# Altium schematic symbol library Molex FFC - FPC Connectors (SMT).SchLib: 638 symbols (part 9 of 10) (continued)
## 501912-2790 (continued)
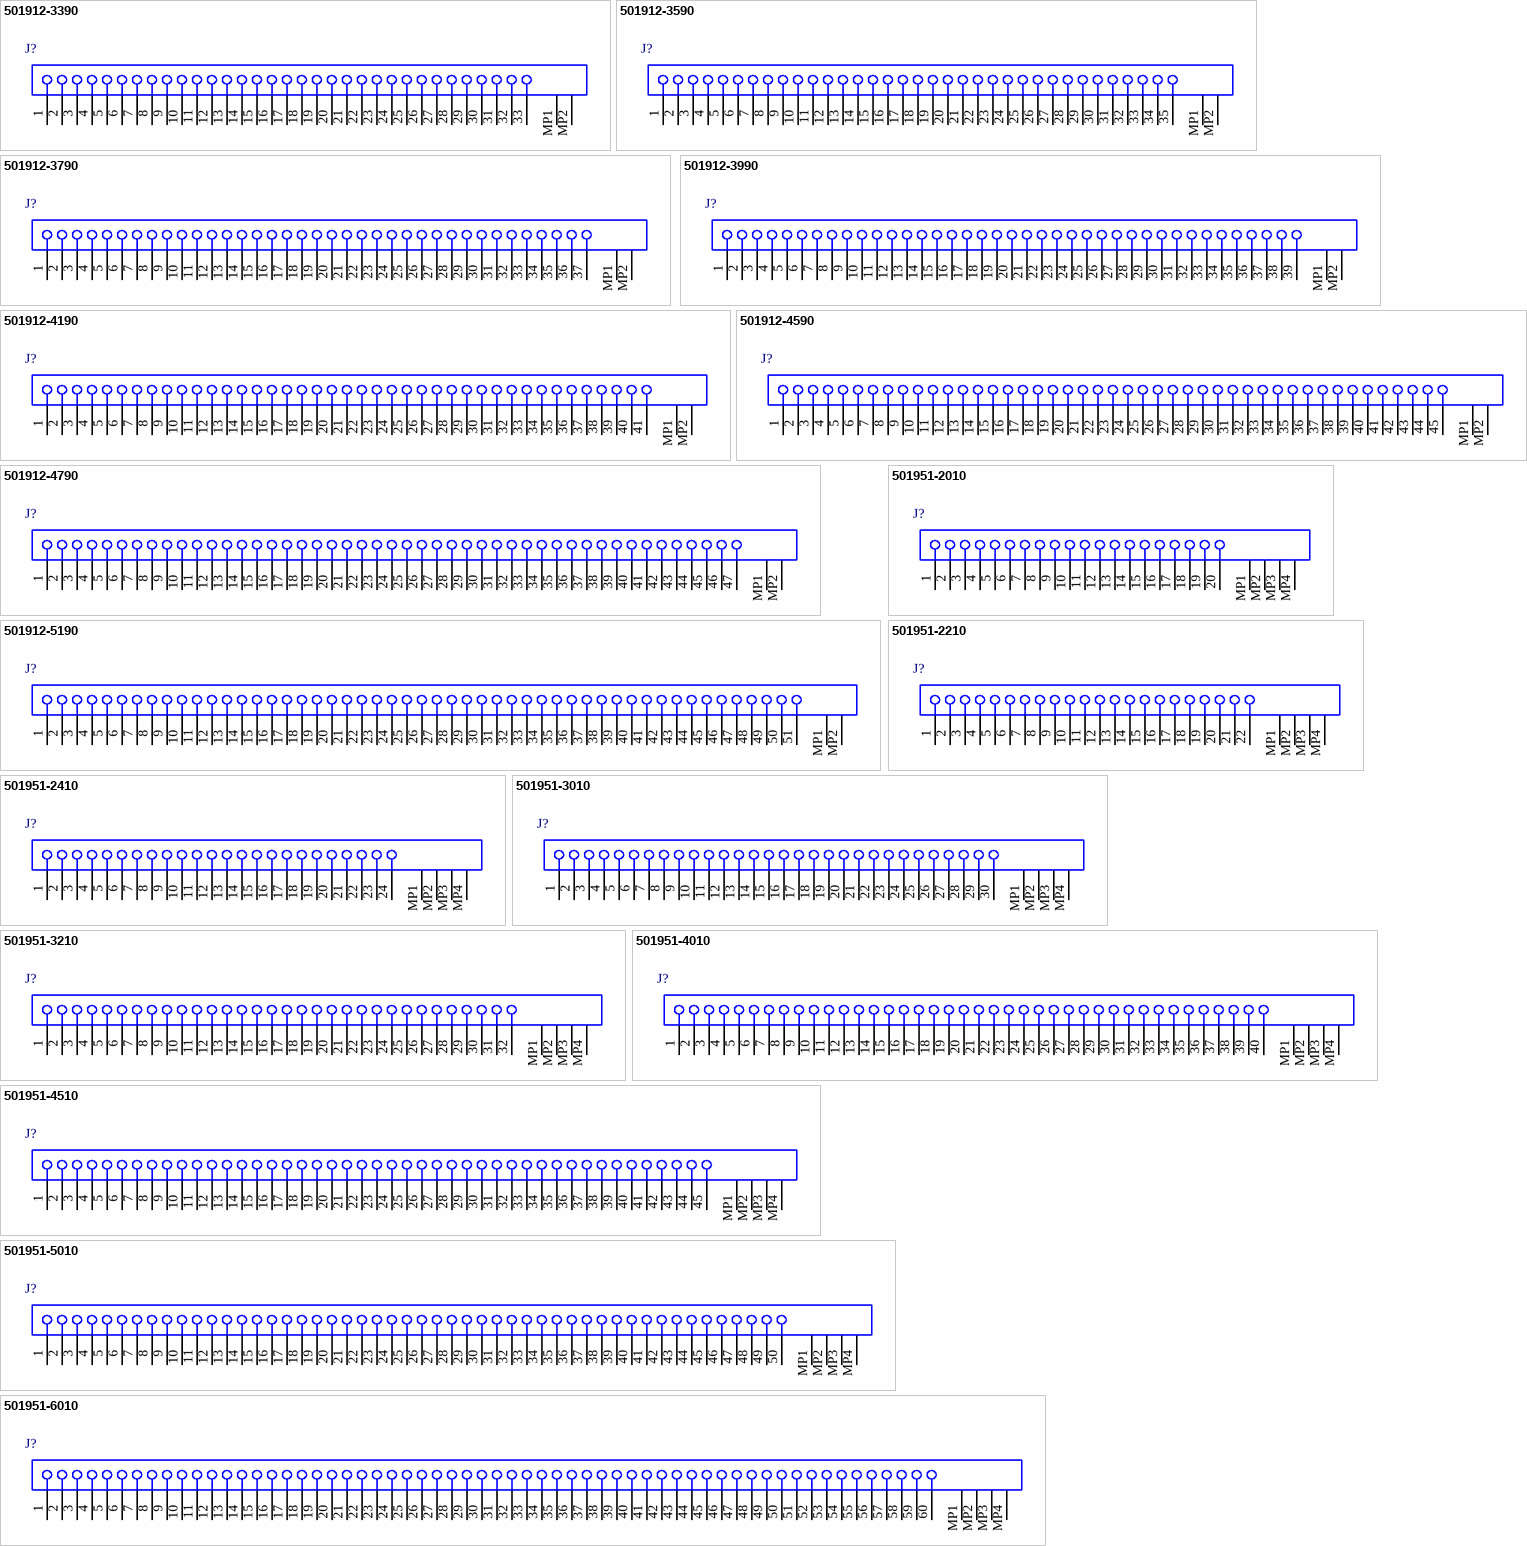
[diagram p17: symbols 501912-3390 to 501951-6010]

## 501912-3390
designator J?
0.3 mm Pitch Easy-On(TM) Type FPC Connector, 1.8 mm Mated Height, Right Angle, SMT, Bottom Contact, 33 Circuits, -20 to 85 degC, ELV and RoHS Compliant, Tape and Reel; Manufacturer: Molex; PartNumber: 501912-3390; Circuits (Loaded): 33; Current (Max per Contact): 0.2A; Durability (mating cycles max): 20; Entry Angle: 90degrees Angle; Mated Height: 1.80mm; Material - Metal: Copper, Phosphor Bronze; Material - Plating Mating: Gold; PCB Locator: No; PCB Retention: None; Pitch - Mating Interface: 0.30mm; Voltage (Max): 50V AC (RMS)/DC; PackageVersion: Rev. F, 04/2008; PackageReference: 501912-3390; PackageDescription: 33-Lead FPC Connector, Pitch 0.3 mm; Circuits (maximum): 33; Contact Position: Bottom; Material - Plating Termination: Gold; Number of Rows: 1; Orientation: Right Angle; Packing: Tape and Reel; Pitch - Termination Interface: 0.30mm; Polarized to PCB: No; RoHS: TRUE; Stackable: No; Mounting Technology: Surface Mount; ComponentLink1Description: Manufacturer URL; ComponentLink1URL: http://www.molex.com/molex/index.jsp; ComponentLink2Description: Datasheet; ComponentLink2URL: http://www.molex.com/webdocs/datasheets/pdf/en-us/5019123390_FFC_FPC_CONNECTORS.pdf; ComponentLink3Description: Package Specification; ComponentLink3URL: http://www.molex.com/pdm_docs/sd/5019123390_sd.pdf
footprint MOLX-501912-3390 (FPC Connector, 33-Leads, Right Angle, Pitch 0.3 mm, Mated Height 1.8 mm, SMT)
pins: 1, 2, 3, 4, 5, 6, 7, 8, 9, 10, 11, 12, 13, 14, 15, 16, 17, 18, 19, 20, 21, 22, 23, 24, 25, 26, 27, 28, 29, 30, 31, 32, 33, MP1, MP2

## 501912-3590
designator J?
0.3 mm Pitch Easy-On(TM) Type FPC Connector, 1.8 mm Mated Height, Right Angle, SMT, Bottom Contact, 35 Circuits, -20 to 85 degC, ELV and RoHS Compliant, Tape and Reel; Manufacturer: Molex; PartNumber: 501912-3590; Circuits (Loaded): 35; Current (Max per Contact): 0.2A; Durability (mating cycles max): 20; Entry Angle: 90degrees Angle; Mated Height: 1.80mm; Material - Metal: Copper, Phosphor Bronze; Material - Plating Mating: Gold; PCB Locator: No; PCB Retention: None; Pitch - Mating Interface: 0.30mm; Voltage (Max): 50V AC (RMS)/DC; PackageVersion: Rev. F, 04/2008; PackageReference: 501912-3590; PackageDescription: 35-Lead FPC Connector, Pitch 0.3 mm; Circuits (maximum): 35; Contact Position: Bottom; Material - Plating Termination: Gold; Number of Rows: 1; Orientation: Right Angle; Packing: Tape and Reel; Pitch - Termination Interface: 0.30mm; Polarized to PCB: No; RoHS: TRUE; Stackable: No; Mounting Technology: Surface Mount; ComponentLink1Description: Manufacturer URL; ComponentLink1URL: http://www.molex.com/molex/index.jsp; ComponentLink2Description: Datasheet; ComponentLink2URL: http://www.molex.com/webdocs/datasheets/pdf/en-us/5019123590_FFC_FPC_CONNECTORS.pdf; ComponentLink3Description: Package Specification; ComponentLink3URL: http://www.molex.com/pdm_docs/sd/5019123590_sd.pdf
footprint MOLX-501912-3590 (FPC Connector, 35-Leads, Right Angle, Pitch 0.3 mm, Mated Height 1.8 mm, SMT)
pins: 1, 2, 3, 4, 5, 6, 7, 8, 9, 10, 11, 12, 13, 14, 15, 16, 17, 18, 19, 20, 21, 22, 23, 24, 25, 26, 27, 28, 29, 30, 31, 32, 33, 34, 35, MP1, MP2

## 501912-3790
designator J?
0.3 mm Pitch Easy-On(TM) Type FPC Connector, 1.8 mm Mated Height, Right Angle, SMT, Bottom Contact, 37 Circuits, -20 to 85 degC, ELV and RoHS Compliant, Tape and Reel; Manufacturer: Molex; PartNumber: 501912-3790; Circuits (Loaded): 37; Current (Max per Contact): 0.2A; Durability (mating cycles max): 20; Entry Angle: 90degrees Angle; Mated Height: 1.80mm; Material - Metal: Copper, Phosphor Bronze; Material - Plating Mating: Gold; PCB Locator: No; PCB Retention: None; Pitch - Mating Interface: 0.30mm; Voltage (Max): 50V AC (RMS)/DC; PackageVersion: Rev. F, 04/2008; PackageReference: 501912-3790; PackageDescription: 37-Lead FPC Connector, Pitch 0.3 mm; Circuits (maximum): 37; Contact Position: Bottom; Material - Plating Termination: Gold; Number of Rows: 1; Orientation: Right Angle; Packing: Tape and Reel; Pitch - Termination Interface: 0.30mm; Polarized to PCB: No; RoHS: TRUE; Stackable: No; Mounting Technology: Surface Mount; ComponentLink1Description: Manufacturer URL; ComponentLink1URL: http://www.molex.com/molex/index.jsp; ComponentLink2Description: Datasheet; ComponentLink2URL: http://www.molex.com/webdocs/datasheets/pdf/en-us/5019123790_FFC_FPC_CONNECTORS.pdf; ComponentLink3Description: Package Specification; ComponentLink3URL: http://www.molex.com/pdm_docs/sd/5019123790_sd.pdf
footprint MOLX-501912-3790 (FPC Connector, 37-Leads, Right Angle, Pitch 0.3 mm, Mated Height 1.8 mm, SMT)
pins: 1, 2, 3, 4, 5, 6, 7, 8, 9, 10, 11, 12, 13, 14, 15, 16, 17, 18, 19, 20, 21, 22, 23, 24, 25, 26, 27, 28, 29, 30, 31, 32, 33, 34, 35, 36, 37, MP1, MP2

## 501912-3990
designator J?
0.3 mm Pitch Easy-On(TM) Type FPC Connector, 1.8 mm Mated Height, Right Angle, SMT, Bottom Contact, 39 Circuits, -20 to 85 degC, ELV and RoHS Compliant, Tape and Reel; Manufacturer: Molex; PartNumber: 501912-3990; Circuits (Loaded): 39; Current (Max per Contact): 0.2A; Durability (mating cycles max): 20; Entry Angle: 90degrees Angle; Mated Height: 1.80mm; Material - Metal: Copper, Phosphor Bronze; Material - Plating Mating: Gold; PCB Locator: No; PCB Retention: None; Pitch - Mating Interface: 0.30mm; Voltage (Max): 50V AC (RMS)/DC; PackageVersion: Rev. F, 04/2008; PackageReference: 501912-3990; PackageDescription: 39-Lead FPC Connector, Pitch 0.3 mm; Circuits (maximum): 39; Contact Position: Bottom; Material - Plating Termination: Gold; Number of Rows: 1; Orientation: Right Angle; Packing: Tape and Reel; Pitch - Termination Interface: 0.30mm; Polarized to PCB: No; RoHS: TRUE; Stackable: No; Mounting Technology: Surface Mount; ComponentLink1Description: Manufacturer URL; ComponentLink1URL: http://www.molex.com/molex/index.jsp; ComponentLink2Description: Datasheet; ComponentLink2URL: http://www.molex.com/webdocs/datasheets/pdf/en-us/5019123990_FFC_FPC_CONNECTORS.pdf; ComponentLink3Description: Package Specification; ComponentLink3URL: http://www.molex.com/pdm_docs/sd/5019123990_sd.pdf
footprint MOLX-501912-3990 (FPC Connector, 39-Leads, Right Angle, Pitch 0.3 mm, Mated Height 1.8 mm, SMT)
pins: 1, 2, 3, 4, 5, 6, 7, 8, 9, 10, 11, 12, 13, 14, 15, 16, 17, 18, 19, 20, 21, 22, 23, 24, 25, 26, 27, 28, 29, 30, 31, 32, 33, 34, 35, 36, 37, 38, 39, MP1, MP2

## 501912-4190
designator J?
0.3 mm Pitch Easy-On(TM) Type FPC Connector, 1.8 mm Mated Height, Right Angle, SMT, Bottom Contact, 41 Circuits, -20 to 85 degC, ELV and RoHS Compliant, Tape and Reel; Manufacturer: Molex; PartNumber: 501912-4190; Circuits (Loaded): 41; Current (Max per Contact): 0.2A; Durability (mating cycles max): 20; Entry Angle: 90degrees Angle; Mated Height: 1.80mm; Material - Metal: Copper, Phosphor Bronze; Material - Plating Mating: Gold; PCB Locator: No; PCB Retention: None; Pitch - Mating Interface: 0.30mm; Voltage (Max): 50V AC (RMS)/DC; PackageVersion: Rev. F, 04/2008; PackageReference: 501912-4190; PackageDescription: 41-Lead FPC Connector, Pitch 0.3 mm; Circuits (maximum): 41; Contact Position: Bottom; Material - Plating Termination: Gold; Number of Rows: 1; Orientation: Right Angle; Packing: Tape and Reel; Pitch - Termination Interface: 0.30mm; Polarized to PCB: No; RoHS: TRUE; Stackable: No; Mounting Technology: Surface Mount; ComponentLink1Description: Manufacturer URL; ComponentLink1URL: http://www.molex.com/molex/index.jsp; ComponentLink2Description: Datasheet; ComponentLink2URL: http://www.molex.com/webdocs/datasheets/pdf/en-us/5019124190_FFC_FPC_CONNECTORS.pdf; ComponentLink3Description: Package Specification; ComponentLink3URL: http://www.molex.com/pdm_docs/sd/5019124190_sd.pdf
footprint MOLX-501912-4190 (FPC Connector, 41-Leads, Right Angle, Pitch 0.3 mm, Mated Height 1.8 mm, SMT)
pins: 1, 2, 3, 4, 5, 6, 7, 8, 9, 10, 11, 12, 13, 14, 15, 16, 17, 18, 19, 20, 21, 22, 23, 24, 25, 26, 27, 28, 29, 30, 31, 32, 33, 34, 35, 36, 37, 38, 39, 40, 41, MP1, MP2

## 501912-4590
designator J?
0.3 mm Pitch Easy-On(TM) Type FPC Connector, 1.8 mm Mated Height, Right Angle, SMT, Bottom Contact, 45 Circuits, -20 to 85 degC, ELV and RoHS Compliant, Tape and Reel; Manufacturer: Molex; PartNumber: 501912-4590; Circuits (Loaded): 45; Current (Max per Contact): 0.2A; Durability (mating cycles max): 20; Entry Angle: 90degrees Angle; Mated Height: 1.80mm; Material - Metal: Copper, Phosphor Bronze; Material - Plating Mating: Gold; PCB Locator: No; PCB Retention: None; Pitch - Mating Interface: 0.30mm; Voltage (Max): 50V AC (RMS)/DC; PackageVersion: Rev. F, 04/2008; PackageReference: 501912-4590; PackageDescription: 45-Lead FPC Connector, Pitch 0.3 mm; Circuits (maximum): 45; Contact Position: Bottom; Material - Plating Termination: Gold; Number of Rows: 1; Orientation: Right Angle; Packing: Tape and Reel; Pitch - Termination Interface: 0.30mm; Polarized to PCB: No; RoHS: TRUE; Stackable: No; Mounting Technology: Surface Mount; ComponentLink1Description: Manufacturer URL; ComponentLink1URL: http://www.molex.com/molex/index.jsp; ComponentLink2Description: Datasheet; ComponentLink2URL: http://www.molex.com/webdocs/datasheets/pdf/en-us/5019124590_FFC_FPC_CONNECTORS.pdf; ComponentLink3Description: Package Specification; ComponentLink3URL: http://www.molex.com/pdm_docs/sd/5019124590_sd.pdf
footprint MOLX-501912-4590 (FPC Connector, 45-Leads, Right Angle, Pitch 0.3 mm, Mated Height 1.8 mm, SMT)
pins: 1, 2, 3, 4, 5, 6, 7, 8, 9, 10, 11, 12, 13, 14, 15, 16, 17, 18, 19, 20, 21, 22, 23, 24, 25, 26, 27, 28, 29, 30, 31, 32, 33, 34, 35, 36, 37, 38, 39, 40, 41, 42, 43, 44, 45, MP1, MP2

## 501912-4790
designator J?
0.3 mm Pitch Easy-On(TM) Type FPC Connector, 1.8 mm Mated Height, Right Angle, SMT, Bottom Contact, 47 Circuits, -20 to 85 degC, ELV and RoHS Compliant, Tape and Reel; Manufacturer: Molex; PartNumber: 501912-4790; Circuits (Loaded): 47; Current (Max per Contact): 0.2A; Durability (mating cycles max): 20; Entry Angle: 90degrees Angle; Mated Height: 1.80mm; Material - Metal: Copper, Phosphor Bronze; Material - Plating Mating: Gold; PCB Locator: No; PCB Retention: None; Pitch - Mating Interface: 0.30mm; Voltage (Max): 50V AC (RMS)/DC; PackageVersion: Rev. F, 04/2008; PackageReference: 501912-4790; PackageDescription: 47-Lead FPC Connector, Pitch 0.3 mm; Circuits (maximum): 47; Contact Position: Bottom; Material - Plating Termination: Gold; Number of Rows: 1; Orientation: Right Angle; Packing: Tape and Reel; Pitch - Termination Interface: 0.30mm; Polarized to PCB: No; RoHS: TRUE; Stackable: No; Mounting Technology: Surface Mount; ComponentLink1Description: Manufacturer URL; ComponentLink1URL: http://www.molex.com/molex/index.jsp; ComponentLink2Description: Datasheet; ComponentLink2URL: http://www.molex.com/webdocs/datasheets/pdf/en-us/5019124790_FFC_FPC_CONNECTORS.pdf; ComponentLink3Description: Package Specification; ComponentLink3URL: http://www.molex.com/pdm_docs/sd/5019124790_sd.pdf
footprint MOLX-501912-4790 (FPC Connector, 47-Leads, Right Angle, Pitch 0.3 mm, Mated Height 1.8 mm, SMT)
pins: 1, 2, 3, 4, 5, 6, 7, 8, 9, 10, 11, 12, 13, 14, 15, 16, 17, 18, 19, 20, 21, 22, 23, 24, 25, 26, 27, 28, 29, 30, 31, 32, 33, 34, 35, 36, 37, 38, 39, 40, 41, 42, 43, 44, 45, 46, 47, MP1, MP2

## 501912-5190
designator J?
0.3 mm Pitch Easy-On(TM) Type FPC Connector, 1.8 mm Mated Height, Right Angle, SMT, Bottom Contact, 51 Circuits, -20 to 85 degC, ELV and RoHS Compliant, Tape and Reel; Manufacturer: Molex; PartNumber: 501912-5190; Circuits (Loaded): 51; Current (Max per Contact): 0.2A; Durability (mating cycles max): 20; Entry Angle: 90degrees Angle; Mated Height: 1.80mm; Material - Metal: Copper, Phosphor Bronze; Material - Plating Mating: Gold; PCB Locator: No; PCB Retention: None; Pitch - Mating Interface: 0.30mm; Voltage (Max): 50V AC (RMS)/DC; PackageVersion: Rev. F, 04/2008; PackageReference: 501912-5190; PackageDescription: 51-Lead FPC Connector, Pitch 0.3 mm; Circuits (maximum): 51; Contact Position: Bottom; Material - Plating Termination: Gold; Number of Rows: 1; Orientation: Right Angle; Packing: Tape and Reel; Pitch - Termination Interface: 0.30mm; Polarized to PCB: No; RoHS: TRUE; Stackable: No; Mounting Technology: Surface Mount; ComponentLink1Description: Manufacturer URL; ComponentLink1URL: http://www.molex.com/molex/index.jsp; ComponentLink2Description: Datasheet; ComponentLink2URL: http://www.molex.com/webdocs/datasheets/pdf/en-us/5019125190_FFC_FPC_CONNECTORS.pdf; ComponentLink3Description: Package Specification; ComponentLink3URL: http://www.molex.com/pdm_docs/sd/5019125190_sd.pdf
footprint MOLX-501912-5190 (FPC Connector, 51-Leads, Right Angle, Pitch 0.3 mm, Mated Height 1.8 mm, SMT)
pins: 1, 2, 3, 4, 5, 6, 7, 8, 9, 10, 11, 12, 13, 14, 15, 16, 17, 18, 19, 20, 21, 22, 23, 24, 25, 26, 27, 28, 29, 30, 31, 32, 33, 34, 35, 36, 37, 38, 39, 40, 41, 42, 43, 44, 45, 46, 47, 48, 49, 50, 51, MP1, MP2

## 501951-2010
designator J?
0.5 mm Pitch Easy-On(TM) Type FPC Connector, 4.05 mm Mated Height, Vertical, SMT, 20 Circuits, -25 to 85 degC, ELV and RoHS Compliant, Tape and Reel; Manufacturer: Molex; PartNumber: 501951-2010; Circuits (Loaded): 20; Current (Max per Contact): 0.4A; Mated Height: 4.05mm; Material - Metal: Phosphor Bronze; Material - Plating Mating: Gold; PCB Locator: No; PCB Retention: Yes; Pitch - Mating Interface: 0.50mm; Voltage (Max): 50V AC (RMS)/DC; PackageVersion: Rev. E, 01/2011; PackageReference: 501951-2010; PackageDescription: 20-Lead FPC Connector, Pitch 0.5 mm; Circuits (maximum): 20; Contact Position: N/A; Durability (mating cycles max): 20; Entry Angle: Vertical; Material - Plating Termination: Gold; Number of Rows: 1; Orientation: Vertical; Packing: Tape and Reel; Pitch - Termination Interface: 0.50mm; Polarized to PCB: No; RoHS: TRUE; Stackable: No; Mounting Technology: Surface Mount; ComponentLink1Description: Manufacturer URL; ComponentLink1URL: http://www.molex.com/molex/index.jsp; ComponentLink2Description: Datasheet; ComponentLink2URL: http://www.molex.com/webdocs/datasheets/pdf/en-us/5019512010_FFC_FPC_CONNECTORS.pdf; ComponentLink3Description: Package Specification; ComponentLink3URL: http://www.molex.com/pdm_docs/sd/5019512010_sd.pdf
footprint MOLX-501951-2010 (FPC Connector, 20-Leads, Vertical, Pitch 0.5 mm, Mated Height 4.05 mm, SMT)
pins: 1, 2, 3, 4, 5, 6, 7, 8, 9, 10, 11, 12, 13, 14, 15, 16, 17, 18, 19, 20, MP1, MP2, MP3, MP4

## 501951-2210
designator J?
0.5 mm Pitch Easy-On(TM) Type FPC Connector, 4.05 mm Mated Height, Vertical, SMT, 22 Circuits, -25 to 85 degC, ELV and RoHS Compliant, Tape and Reel; Manufacturer: Molex; PartNumber: 501951-2210; Circuits (Loaded): 22; Current (Max per Contact): 0.4A; Durability (mating cycles max): 20; Mated Height: 4.05mm; Material - Metal: Phosphor Bronze; Material - Plating Mating: Gold; PCB Locator: No; PCB Retention: Yes; Pitch - Mating Interface: 0.50mm; Voltage (Max): 50V AC (RMS)/DC; PackageVersion: Rev. E, 01/2011; PackageReference: 501951-2210; PackageDescription: 22-Lead FPC Connector, Pitch 0.5 mm; Circuits (maximum): 22; Contact Position: N/A; Entry Angle: Vertical; Material - Plating Termination: Gold; Number of Rows: 1; Orientation: Vertical; Packing: Tape and Reel; Pitch - Termination Interface: 0.50mm; Polarized to PCB: No; RoHS: TRUE; Stackable: No; Mounting Technology: Surface Mount; ComponentLink1Description: Manufacturer URL; ComponentLink1URL: http://www.molex.com/molex/index.jsp; ComponentLink2Description: Datasheet; ComponentLink2URL: http://www.molex.com/webdocs/datasheets/pdf/en-us/5019512210_FFC_FPC_CONNECTORS.pdf; ComponentLink3Description: Package Specification; ComponentLink3URL: http://www.molex.com/pdm_docs/sd/5019512210_sd.pdf
footprint MOLX-501951-2210 (FPC Connector, 22-Leads, Vertical, Pitch 0.5 mm, Mated Height 4.05 mm, SMT)
pins: 1, 2, 3, 4, 5, 6, 7, 8, 9, 10, 11, 12, 13, 14, 15, 16, 17, 18, 19, 20, 21, 22, MP1, MP2, MP3, MP4

## 501951-2410
designator J?
0.5 mm Pitch Easy-On(TM) Type FPC Connector, 4.05 mm Mated Height, Vertical, SMT, 24 Circuits, -25 to 85 degC, ELV and RoHS Compliant, Tape and Reel; Manufacturer: Molex; PartNumber: 501951-2410; Circuits (Loaded): 24; Current (Max per Contact): 0.4A; Durability (mating cycles max): 20; Mated Height: 4.05mm; Material - Metal: Phosphor Bronze; Material - Plating Mating: Gold; PCB Locator: No; PCB Retention: Yes; Pitch - Mating Interface: 0.50mm; Voltage (Max): 50V AC (RMS)/DC; PackageVersion: Rev. E, 01/2011; PackageReference: 501951-2410; PackageDescription: 24-Lead FPC Connector, Pitch 0.5 mm; Circuits (maximum): 24; Contact Position: N/A; Entry Angle: Vertical; Material - Plating Termination: Gold; Number of Rows: 1; Orientation: Vertical; Packing: Tape and Reel; Pitch - Termination Interface: 0.50mm; Polarized to PCB: No; RoHS: TRUE; Stackable: No; Mounting Technology: Surface Mount; ComponentLink1Description: Manufacturer URL; ComponentLink1URL: http://www.molex.com/molex/index.jsp; ComponentLink2Description: Datasheet; ComponentLink2URL: http://www.molex.com/webdocs/datasheets/pdf/en-us/5019512410_FFC_FPC_CONNECTORS.pdf; ComponentLink3Description: Package Specification; ComponentLink3URL: http://www.molex.com/pdm_docs/sd/5019512410_sd.pdf
footprint MOLX-501951-2410 (FPC Connector, 24-Leads, Vertical, Pitch 0.5 mm, Mated Height 4.05 mm, SMT)
pins: 1, 2, 3, 4, 5, 6, 7, 8, 9, 10, 11, 12, 13, 14, 15, 16, 17, 18, 19, 20, 21, 22, 23, 24, MP1, MP2, MP3, MP4

## 501951-3010
designator J?
0.5 mm Pitch Easy-On(TM) Type FPC Connector, 4.05 mm Mated Height, Vertical, SMT, 30 Circuits, -25 to 85 degC, ELV and RoHS Compliant, Tape and Reel; Manufacturer: Molex; PartNumber: 501951-3010; Circuits (Loaded): 30; Current (Max per Contact): 0.4A; Durability (mating cycles max): 20; Mated Height: 4.05mm; Material - Metal: Phosphor Bronze; Material - Plating Mating: Gold; PCB Locator: No; PCB Retention: Yes; Pitch - Mating Interface: 0.50mm; Voltage (Max): 50V AC (RMS)/DC; PackageVersion: Rev. E, 01/2011; PackageReference: 501951-3010; PackageDescription: 30-Lead FPC Connector, Pitch 0.5 mm; Circuits (maximum): 30; Contact Position: N/A; Entry Angle: Vertical; Material - Plating Termination: Gold; Number of Rows: 1; Orientation: Vertical; Packing: Tape and Reel; Pitch - Termination Interface: 0.50mm; Polarized to PCB: No; RoHS: TRUE; Stackable: No; Mounting Technology: Surface Mount; ComponentLink1Description: Manufacturer URL; ComponentLink1URL: http://www.molex.com/molex/index.jsp; ComponentLink2Description: Datasheet; ComponentLink2URL: http://www.molex.com/webdocs/datasheets/pdf/en-us/5019513010_FFC_FPC_CONNECTORS.pdf; ComponentLink3Description: Package Specification; ComponentLink3URL: http://www.molex.com/pdm_docs/sd/5019513010_sd.pdf
footprint MOLX-501951-3010 (FPC Connector, 30-Leads, Vertical, Pitch 0.5 mm, Mated Height 4.05 mm, SMT)
pins: 1, 2, 3, 4, 5, 6, 7, 8, 9, 10, 11, 12, 13, 14, 15, 16, 17, 18, 19, 20, 21, 22, 23, 24, 25, 26, 27, 28, 29, 30, MP1, MP2, MP3, MP4

## 501951-3210
designator J?
0.5 mm Pitch Easy-On(TM) Type FPC Connector, 4.05 mm Mated Height, Vertical, SMT, 32 Circuits, -25 to 85 degC, ELV and RoHS Compliant, Tape and Reel; Manufacturer: Molex; PartNumber: 501951-3210; Circuits (Loaded): 32; Current (Max per Contact): 0.4A; Durability (mating cycles max): 20; Mated Height: 4.05mm; Material - Metal: Phosphor Bronze; Material - Plating Mating: Gold; PCB Locator: No; PCB Retention: Yes; Pitch - Mating Interface: 0.50mm; Voltage (Max): 50V AC (RMS)/DC; PackageVersion: Rev. E, 01/2011; PackageReference: 501951-3210; PackageDescription: 32-Lead FPC Connector, Pitch 0.5 mm; Circuits (maximum): 32; Contact Position: N/A; Entry Angle: Vertical; Material - Plating Termination: Gold; Number of Rows: 1; Orientation: Vertical; Packing: Tape and Reel; Pitch - Termination Interface: 0.50mm; Polarized to PCB: No; RoHS: TRUE; Stackable: No; Mounting Technology: Surface Mount; ComponentLink1Description: Manufacturer URL; ComponentLink1URL: http://www.molex.com/molex/index.jsp; ComponentLink2Description: Datasheet; ComponentLink2URL: http://www.molex.com/webdocs/datasheets/pdf/en-us/5019513210_FFC_FPC_CONNECTORS.pdf; ComponentLink3Description: Package Specification; ComponentLink3URL: http://www.molex.com/pdm_docs/sd/5019513210_sd.pdf
footprint MOLX-501951-3210 (FPC Connector, 32-Leads, Vertical, Pitch 0.5 mm, Mated Height 4.05 mm, SMT)
pins: 1, 2, 3, 4, 5, 6, 7, 8, 9, 10, 11, 12, 13, 14, 15, 16, 17, 18, 19, 20, 21, 22, 23, 24, 25, 26, 27, 28, 29, 30, 31, 32, MP1, MP2, MP3, MP4

## 501951-4010
designator J?
0.5 mm Pitch Easy-On(TM) Type FPC Connector, 4.05 mm Mated Height, Vertical, SMT, 40 Circuits, -25 to 85 degC, ELV and RoHS Compliant, Tape and Reel; Manufacturer: Molex; PartNumber: 501951-4010; Circuits (Loaded): 40; Current (Max per Contact): 0.4A; Durability (mating cycles max): 20; Mated Height: 4.05mm; Material - Metal: Phosphor Bronze; Material - Plating Mating: Gold; PCB Locator: No; PCB Retention: Yes; Pitch - Mating Interface: 0.50mm; Voltage (Max): 50V AC (RMS)/DC; PackageVersion: Rev. E, 01/2011; PackageReference: 501951-4010; PackageDescription: 40-Lead FPC Connector, Pitch 0.5 mm; Circuits (maximum): 40; Contact Position: N/A; Entry Angle: Vertical; Material - Plating Termination: Gold; Number of Rows: 1; Orientation: Vertical; Packing: Tape and Reel; Pitch - Termination Interface: 0.50mm; Polarized to PCB: No; RoHS: TRUE; Stackable: No; Mounting Technology: Surface Mount; ComponentLink1Description: Manufacturer URL; ComponentLink1URL: http://www.molex.com/molex/index.jsp; ComponentLink2Description: Datasheet; ComponentLink2URL: http://www.molex.com/webdocs/datasheets/pdf/en-us/5019514010_FFC_FPC_CONNECTORS.pdf; ComponentLink3Description: Package Specification; ComponentLink3URL: http://www.molex.com/pdm_docs/sd/5019514010_sd.pdf
footprint MOLX-501951-4010 (FPC Connector, 40-Leads, Vertical, Pitch 0.5 mm, Mated Height 4.05 mm, SMT)
pins: 1, 2, 3, 4, 5, 6, 7, 8, 9, 10, 11, 12, 13, 14, 15, 16, 17, 18, 19, 20, 21, 22, 23, 24, 25, 26, 27, 28, 29, 30, 31, 32, 33, 34, 35, 36, 37, 38, 39, 40, MP1, MP2, MP3, MP4

## 501951-4510
designator J?
0.5 mm Pitch Easy-On(TM) Type FPC Connector, 4.05 mm Mated Height, Vertical, SMT, 45 Circuits, -25 to 85 degC, ELV and RoHS Compliant, Tape and Reel; Manufacturer: Molex; PartNumber: 501951-4510; Circuits (Loaded): 45; Current (Max per Contact): 0.4A; Durability (mating cycles max): 20; Mated Height: 4.05mm; Material - Metal: Phosphor Bronze; Material - Plating Mating: Gold; PCB Locator: No; PCB Retention: Yes; Pitch - Mating Interface: 0.50mm; Voltage (Max): 50V AC (RMS)/DC; PackageVersion: Rev. E, 01/2011; PackageReference: 501951-4510; PackageDescription: 45-Lead FPC Connector, Pitch 0.5 mm; Circuits (maximum): 45; Contact Position: N/A; Entry Angle: Vertical; Material - Plating Termination: Gold; Number of Rows: 1; Orientation: Vertical; Packing: Tape and Reel; Pitch - Termination Interface: 0.50mm; Polarized to PCB: No; RoHS: TRUE; Stackable: No; Mounting Technology: Surface Mount; ComponentLink1Description: Manufacturer URL; ComponentLink1URL: http://www.molex.com/molex/index.jsp; ComponentLink2Description: Datasheet; ComponentLink2URL: http://www.molex.com/webdocs/datasheets/pdf/en-us/5019514510_FFC_FPC_CONNECTORS.pdf; ComponentLink3Description: Package Specification; ComponentLink3URL: http://www.molex.com/pdm_docs/sd/5019514510_sd.pdf
footprint MOLX-501951-4510 (FPC Connector, 45-Leads, Vertical, Pitch 0.5 mm, Mated Height 4.05 mm, SMT)
pins: 1, 2, 3, 4, 5, 6, 7, 8, 9, 10, 11, 12, 13, 14, 15, 16, 17, 18, 19, 20, 21, 22, 23, 24, 25, 26, 27, 28, 29, 30, 31, 32, 33, 34, 35, 36, 37, 38, 39, 40, 41, 42, 43, 44, 45, MP1, MP2, MP3, MP4

## 501951-5010
designator J?
0.5 mm Pitch Easy-On(TM) Type FPC Connector, 4.05 mm Mated Height, Vertical, SMT, 50 Circuits, -25 to 85 degC, ELV and RoHS Compliant, Tape and Reel; Manufacturer: Molex; PartNumber: 501951-5010; Circuits (Loaded): 50; Current (Max per Contact): 0.4A; Durability (mating cycles max): 20; Mated Height: 4.05mm; Material - Metal: Phosphor Bronze; Material - Plating Mating: Gold; PCB Locator: No; PCB Retention: Yes; Pitch - Mating Interface: 0.50mm; Voltage (Max): 50V AC (RMS)/DC; PackageVersion: Rev. E, 01/2011; PackageReference: 501951-5010; PackageDescription: 50-Lead FPC Connector, Pitch 0.5 mm; Circuits (maximum): 50; Contact Position: N/A; Entry Angle: Vertical; Material - Plating Termination: Gold; Number of Rows: 1; Orientation: Vertical; Packing: Tape and Reel; Pitch - Termination Interface: 0.50mm; Polarized to PCB: No; RoHS: TRUE; Stackable: No; Mounting Technology: Surface Mount; ComponentLink1Description: Manufacturer URL; ComponentLink1URL: http://www.molex.com/molex/index.jsp; ComponentLink2Description: Datasheet; ComponentLink2URL: http://www.molex.com/webdocs/datasheets/pdf/en-us/5019515010_FFC_FPC_CONNECTORS.pdf; ComponentLink3Description: Package Specification; ComponentLink3URL: http://www.molex.com/pdm_docs/sd/5019515010_sd.pdf
footprint MOLX-501951-5010 (FPC Connector, 50-Leads, Vertical, Pitch 0.5 mm, Mated Height 4.05 mm, SMT)
pins: 1, 2, 3, 4, 5, 6, 7, 8, 9, 10, 11, 12, 13, 14, 15, 16, 17, 18, 19, 20, 21, 22, 23, 24, 25, 26, 27, 28, 29, 30, 31, 32, 33, 34, 35, 36, 37, 38, 39, 40, 41, 42, 43, 44, 45, 46, 47, 48, 49, 50, MP1, MP2, MP3, MP4

## 501951-6010
designator J?
0.5 mm Pitch Easy-On(TM) Type FPC Connector, 4.05 mm Mated Height, Vertical, SMT, 60 Circuits, -25 to 85 degC, ELV and RoHS Compliant, Tape and Reel; Manufacturer: Molex; PartNumber: 501951-6010; Circuits (Loaded): 60; Current (Max per Contact): 0.4A; Durability (mating cycles max): 20; Mated Height: 4.05mm; Material - Metal: Phosphor Bronze; Material - Plating Mating: Gold; PCB Locator: No; PCB Retention: Yes; Pitch - Mating Interface: 0.50mm; Voltage (Max): 50V AC (RMS)/DC; PackageVersion: Rev. E, 01/2011; PackageReference: 501951-6010; PackageDescription: 60-Lead FPC Connector, Pitch 0.5 mm; Circuits (maximum): 60; Contact Position: N/A; Entry Angle: Vertical; Material - Plating Termination: Gold; Number of Rows: 1; Orientation: Vertical; Packing: Tape and Reel; Pitch - Termination Interface: 0.50mm; Polarized to PCB: No; RoHS: TRUE; Stackable: No; Mounting Technology: Surface Mount; ComponentLink1Description: Manufacturer URL; ComponentLink1URL: http://www.molex.com/molex/index.jsp; ComponentLink2Description: Datasheet; ComponentLink2URL: http://www.molex.com/webdocs/datasheets/pdf/en-us/5019516010_FFC_FPC_CONNECTORS.pdf; ComponentLink3Description: Package Specification; ComponentLink3URL: http://www.molex.com/pdm_docs/sd/5019516010_sd.pdf
footprint MOLX-501951-6010 (FPC Connector, 60-Leads, Vertical, Pitch 0.5 mm, Mated Height 4.05 mm, SMT)
pins: 1, 2, 3, 4, 5, 6, 7, 8, 9, 10, 11, 12, 13, 14, 15, 16, 17, 18, 19, 20, 21, 22, 23, 24, 25, 26, 27, 28, 29, 30, 31, 32, 33, 34, 35, 36, 37, 38, 39, 40, 41, 42, 43, 44, 45, 46, 47, 48, 49, 50, 51, 52, 53, 54, 55, 56, 57, 58, 59, 60, MP1, MP2, MP3, MP4
